# Altium footprint library DEMO板PCB封装.PcbLib: 34 footprints (part 3 of 3)
Each footprint in its own frame and in the unit in brackets; x right, y up, seen from the top. Pads: shape width x height; smd on the part's side, far side on the other; paste and mask are expansions set on the pad; w line width, h text height; cw(c..) or ccw(c..) is an arc to the next point about the centre after c.
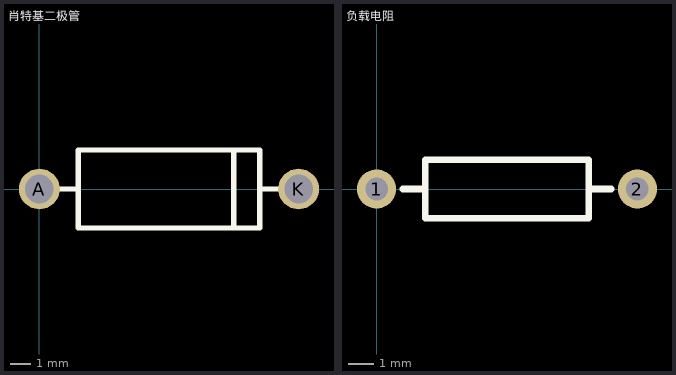
[diagram p2: the footprints below, top view; thin cyan lines are the x and y axes]

## 肖特基二极管 [mm]
pads (2):
  round 2 hole 1.4: A(0,0) K(12.7,0)
Top Overlay:
  lines w0.254: 1.016,0 1.905,0 ; 9.525,-1.905 9.525,1.905 ; 10.795,0 11.684,0 ; 1.905,-1.905 1.905,1.905 10.795,1.905 10.795,-1.905 1.905,-1.905

## 负载电阻 [mil]
pads (2):
  round 60 hole 34.65: 1(0,0) 2(400,0)
Top Overlay:
  lines w10: 40,0 75,0 ; 325,0 360,0 ; 75,-45 325,-45 325,45 75,45 75,-45